# Altium footprint library SMD_Bauteile.PcbLib: 355 footprints (part 10 of 23)
Each footprint in its own frame and in the unit in brackets; x right, y up, seen from the top. Pads: shape width x height; smd on the part's side, far side on the other; paste and mask are expansions set on the pad; w line width, h text height; cw(c..) or ccw(c..) is an arc to the next point about the centre after c.
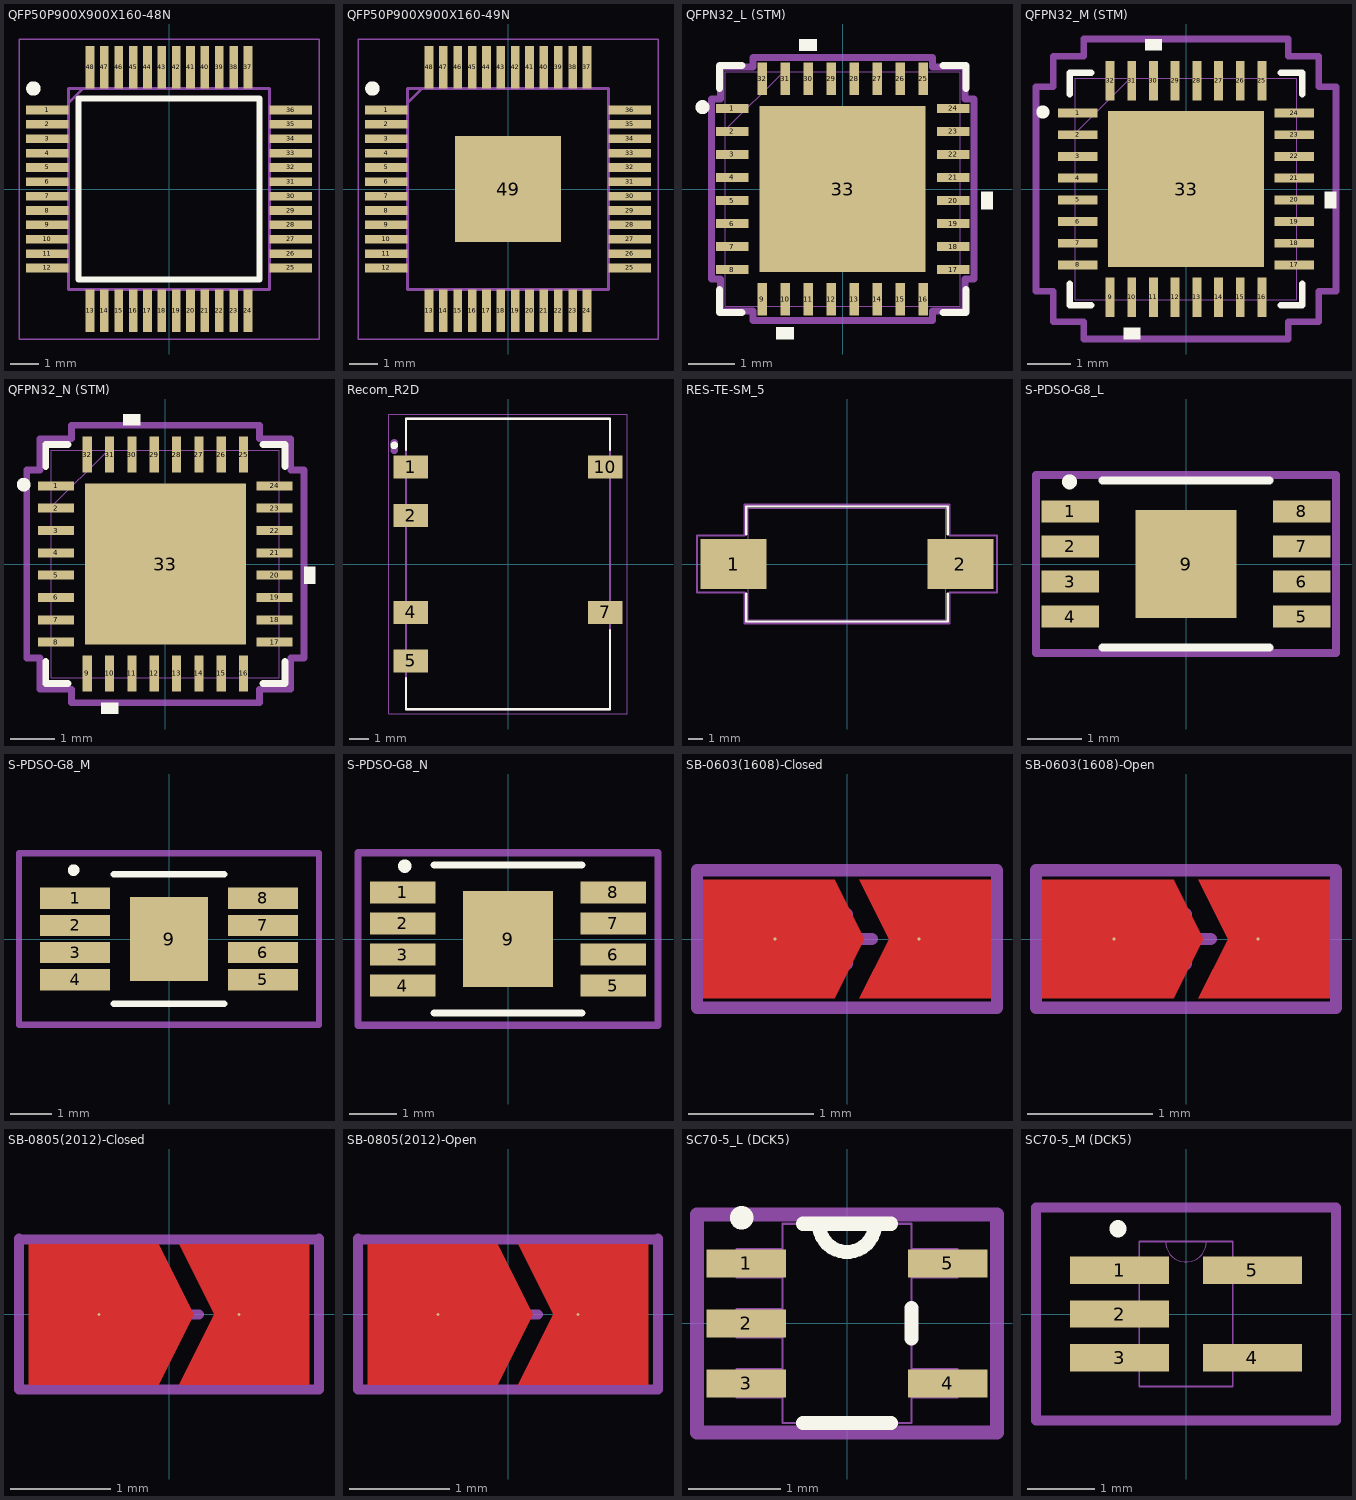
[diagram p9: the footprints below, top view; thin cyan lines are the x and y axes]

## QFP50P900X900X160-48N [mm]
pads (48):
  rect 1.475x0.3 smd: 1(-4.238,2.75) 2(-4.238,2.25) 3(-4.238,1.75) 4(-4.238,1.25) 5(-4.238,0.75) 6(-4.238,0.25) 7(-4.238,-0.25) 8(-4.238,-0.75) 9(-4.238,-1.25) 10(-4.238,-1.75) 11(-4.238,-2.25) 12(-4.238,-2.75) 25(4.238,-2.75) 26(4.238,-2.25) 27(4.238,-1.75) 28(4.238,-1.25) 29(4.238,-0.75) 30(4.238,-0.25) 31(4.238,0.25) 32(4.238,0.75) 33(4.238,1.25) 34(4.238,1.75) 35(4.238,2.25) 36(4.238,2.75)
  rect 0.3x1.475 smd: 13(-2.75,-4.238) 14(-2.25,-4.238) 15(-1.75,-4.238) 16(-1.25,-4.238) 17(-0.75,-4.238) 18(-0.25,-4.238) 19(0.25,-4.238) 20(0.75,-4.238) 21(1.25,-4.238) 22(1.75,-4.238) 23(2.25,-4.238) 24(2.75,-4.238) 37(2.75,4.238) 38(2.25,4.238) 39(1.75,4.238) 40(1.25,4.238) 41(0.75,4.238) 42(0.25,4.238) 43(-0.25,4.238) 44(-0.75,4.238) 45(-1.25,4.238) 46(-1.75,4.238) 47(-2.25,4.238) 48(-2.75,4.238)
Top Overlay:
  circle w0.25: c-4.725,3.5 r0.125
  lines w0.2: -3.15,-3.15 3.15,-3.15 3.15,3.15 -3.15,3.15 -3.15,-3.15
Mech Misc 1:
  lines w0.1: -3.5,3 -3,3.5 ; -3.5,-3.5 3.5,-3.5 3.5,3.5 -3.5,3.5 -3.5,-3.5
Mech 15:
  lines w0.05: -5.225,-5.225 5.225,-5.225 5.225,5.225 -5.225,5.225 -5.225,-5.225
3D body "LTC2357CLX-18#PBF.stp": height 1.6, standoff 0, extent -4.5,-4.5 4.5,4.5

## QFP50P900X900X160-49N [mm]
pads (49):
  rect 1.475x0.3 smd: 1(-4.238,2.75) 2(-4.238,2.25) 3(-4.238,1.75) 4(-4.238,1.25) 5(-4.238,0.75) 6(-4.238,0.25) 7(-4.238,-0.25) 8(-4.238,-0.75) 9(-4.238,-1.25) 10(-4.238,-1.75) 11(-4.238,-2.25) 12(-4.238,-2.75) 25(4.238,-2.75) 26(4.238,-2.25) 27(4.238,-1.75) 28(4.238,-1.25) 29(4.238,-0.75) 30(4.238,-0.25) 31(4.238,0.25) 32(4.238,0.75) 33(4.238,1.25) 34(4.238,1.75) 35(4.238,2.25) 36(4.238,2.75)
  rect 0.3x1.475 smd: 13(-2.75,-4.238) 14(-2.25,-4.238) 15(-1.75,-4.238) 16(-1.25,-4.238) 17(-0.75,-4.238) 18(-0.25,-4.238) 19(0.25,-4.238) 20(0.75,-4.238) 21(1.25,-4.238) 22(1.75,-4.238) 23(2.25,-4.238) 24(2.75,-4.238) 37(2.75,4.238) 38(2.25,4.238) 39(1.75,4.238) 40(1.25,4.238) 41(0.75,4.238) 42(0.25,4.238) 43(-0.25,4.238) 44(-0.75,4.238) 45(-1.25,4.238) 46(-1.75,4.238) 47(-2.25,4.238) 48(-2.75,4.238)
  rect 3.7x3.7 smd: 49(0,0)
Top Overlay:
  circle w0.25: c-4.725,3.5 r0.125
Mech 15:
  lines w0.1: -3.5,3 -3,3.5 ; -3.5,-3.5 -3.5,3.5 3.5,3.5 3.5,-3.5 -3.5,-3.5
Top 3D Body:
  lines w0.05: -5.225,-5.225 -5.225,5.225 5.225,5.225 5.225,-5.225 -5.225,-5.225

## QFPN32_L (STM) [mil]
pads (33):
  rect 27.87x8.03 smd paste+0 mask+0: 1(-94.44,68.92) 2(-94.44,49.23) 3(-94.44,29.54) 4(-94.44,9.85) 5(-94.44,-9.85) 6(-94.44,-29.54) 7(-94.44,-49.23) 8(-94.44,-68.92) 17(94.44,-68.92) 18(94.44,-49.23) 19(94.44,-29.54) 20(94.44,-9.85) 21(94.44,9.85) 22(94.44,29.54) 23(94.44,49.23) 24(94.44,68.92)
  rect 8.03x27.87 smd paste+0 mask+0: 9(-68.92,-94.44) 10(-49.23,-94.44) 11(-29.54,-94.44) 12(-9.85,-94.44) 13(9.85,-94.44) 14(29.54,-94.44) 15(49.23,-94.44) 16(68.92,-94.44) 25(68.92,94.44) 26(49.23,94.44) 27(29.54,94.44) 28(9.85,94.44) 29(-9.85,94.44) 30(-29.54,94.44) 31(-49.23,94.44) 32(-68.92,94.44)
  rect 142x142 smd paste-70.5 mask+0: 33(0,0)
Top Overlay:
  circle w10: c-120,70 r1
  region: -41.73,-118.37 -56.73,-118.37 -56.73,-128.37 -41.73,-128.37
  region: 118.37,-2.35 128.37,-2.35 128.37,-17.34 118.37,-17.34
  region: -22.04,118.37 -37.03,118.37 -37.03,128.37 -22.04,128.37
  lines w6: -105.5,-86.03 -105.5,-105.5 -86.03,-105.5 ; -105.5,86.03 -105.5,105.5 -86.03,105.5 ; 86.03,-105.5 105.5,-105.5 105.5,-86.03 ; 86.03,105.5 105.5,105.5 105.5,86.03
Top Paste:
  region: -3.94,67.06 -67.06,67.06 -67.06,3.94 -3.94,3.94
  region: -3.94,-3.94 -67.06,-3.94 -67.06,-67.06 -3.94,-67.06
  region: 67.06,67.06 3.94,67.06 3.94,3.94 67.06,3.94
  region: 67.06,-3.94 3.94,-3.94 3.94,-67.06 67.06,-67.06
Mech Misc 1:
  lines w1: -100.5,50.5 -50.5,100.5 ; -100.5,-100.5 100.5,-100.5 100.5,100.5 -100.5,100.5 -100.5,-100.5 ; -100.5,-73.92 -100.5,-63.91 -100.5,-73.92 ; -100.5,-54.23 -100.5,-44.23 -100.5,-54.23 ; -100.5,-34.53 -100.5,-24.54 -100.5,-34.53 ; -100.5,-14.85 -100.5,-4.84 -100.5,-14.85 ; -100.5,4.84 -100.5,14.85 -100.5,4.84 ; -100.5,24.54 -100.5,34.53 -100.5,24.54 ; -100.5,44.23 -100.5,54.23 -100.5,44.23 ; -100.5,63.91 -100.5,73.92 -100.5,63.91 ; -73.92,-100.5 -63.91,-100.5 -73.92,-100.5 ; -73.92,100.5 -63.91,100.5 -73.92,100.5 ; -54.23,-100.5 -44.23,-100.5 -54.23,-100.5 ; -54.23,100.5 -44.23,100.5 -54.23,100.5 ; -34.53,-100.5 -24.54,-100.5 -34.53,-100.5 ; -34.53,100.5 -24.54,100.5 -34.53,100.5 ; -14.85,-100.5 -4.84,-100.5 -14.85,-100.5 ; -14.85,100.5 -4.84,100.5 -14.85,100.5 ; 4.84,-100.5 14.85,-100.5 4.84,-100.5 ; 4.84,100.5 14.85,100.5 4.84,100.5 ; 24.54,-100.5 34.53,-100.5 24.54,-100.5 ; 24.54,100.5 34.53,100.5 24.54,100.5 ; 44.23,-100.5 54.23,-100.5 44.23,-100.5 ; 44.23,100.5 54.23,100.5 44.23,100.5 ; 63.91,-100.5 73.92,-100.5 63.91,-100.5 ; 63.91,100.5 73.92,100.5 63.91,100.5 ; 100.5,-73.92 100.5,-63.91 100.5,-73.92 ; 100.5,-54.23 100.5,-44.23 100.5,-54.23 ; 100.5,-34.53 100.5,-24.54 100.5,-34.53 ; 100.5,-14.85 100.5,-4.84 100.5,-14.85 ; 100.5,4.84 100.5,14.85 100.5,4.84 ; 100.5,24.54 100.5,34.53 100.5,24.54 ; 100.5,44.23 100.5,54.23 100.5,44.23 ; 100.5,63.91 100.5,73.92 100.5,63.91
Mech 15:
  lines w6: -112.37,-76.93 -104.5,-76.93 -104.5,-104.5 -76.93,-104.5 -76.93,-112.37 76.93,-112.37 76.93,-104.5 104.5,-104.5 104.5,-76.93 112.37,-76.93 112.37,76.93 104.5,76.93 104.5,104.5 76.93,104.5 76.93,112.37 -76.93,112.37 -76.93,104.5 -104.5,104.5 -104.5,76.93 -112.37,76.93 -112.37,-76.93
3D body "QFPN_91KEU6_STM.step": height 65.12, standoff 0, extent -100.52,-100.51 100.51,100.51

## QFPN32_M (STM) [mil]
pads (33):
  rect 35.75x8.03 smd paste+0 mask+0: 1(-98.37,68.92) 2(-98.37,49.23) 3(-98.37,29.54) 4(-98.37,9.85) 5(-98.37,-9.85) 6(-98.37,-29.54) 7(-98.37,-49.23) 8(-98.37,-68.92) 17(98.37,-68.92) 18(98.37,-49.23) 19(98.37,-29.54) 20(98.37,-9.85) 21(98.37,9.85) 22(98.37,29.54) 23(98.37,49.23) 24(98.37,68.92)
  rect 8.03x35.75 smd paste+0 mask+0: 9(-68.92,-98.37) 10(-49.23,-98.37) 11(-29.54,-98.37) 12(-9.85,-98.37) 13(9.85,-98.37) 14(29.54,-98.37) 15(49.23,-98.37) 16(68.92,-98.37) 25(68.92,98.37) 26(49.23,98.37) 27(29.54,98.37) 28(9.85,98.37) 29(-9.85,98.37) 30(-29.54,98.37) 31(-49.23,98.37) 32(-68.92,98.37)
  rect 142x142 smd paste-70.5 mask+0: 33(0,0)
Top Overlay:
  circle w10: c-130,70 r1
  region: -22.04,126.25 -37.03,126.25 -37.03,136.25 -22.04,136.25
  region: 126.25,-2.35 136.25,-2.35 136.25,-17.34 126.25,-17.34
  region: -41.73,-126.25 -56.73,-126.25 -56.73,-136.25 -41.73,-136.25
  lines w6: -105.5,-86.03 -105.5,-105.5 -86.03,-105.5 ; -105.5,86.03 -105.5,105.5 -86.03,105.5 ; 86.03,-105.5 105.5,-105.5 105.5,-86.03 ; 86.03,105.5 105.5,105.5 105.5,86.03
Top Paste:
  region: 67.06,-3.94 3.94,-3.94 3.94,-67.06 67.06,-67.06
  region: 67.06,67.06 3.94,67.06 3.94,3.94 67.06,3.94
  region: -3.94,-3.94 -67.06,-3.94 -67.06,-67.06 -3.94,-67.06
  region: -3.94,67.06 -67.06,67.06 -67.06,3.94 -3.94,3.94
Mech Misc 1:
  lines w1: -100.5,50.5 -50.5,100.5 ; -100.5,-100.5 -100.5,100.5 100.5,100.5 100.5,-100.5 -100.5,-100.5 ; -100.5,-73.92 -100.5,-63.91 -100.5,-73.92 ; -100.5,-54.23 -100.5,-44.23 -100.5,-54.23 ; -100.5,-34.53 -100.5,-24.54 -100.5,-34.53 ; -100.5,-14.85 -100.5,-4.84 -100.5,-14.85 ; -100.5,4.84 -100.5,14.85 -100.5,4.84 ; -100.5,24.54 -100.5,34.53 -100.5,24.54 ; -100.5,44.23 -100.5,54.23 -100.5,44.23 ; -100.5,63.91 -100.5,73.92 -100.5,63.91 ; -73.92,-100.5 -63.91,-100.5 -73.92,-100.5 ; -73.92,100.5 -63.91,100.5 -73.92,100.5 ; -54.23,-100.5 -44.23,-100.5 -54.23,-100.5 ; -54.23,100.5 -44.23,100.5 -54.23,100.5 ; -34.53,-100.5 -24.54,-100.5 -34.53,-100.5 ; -34.53,100.5 -24.54,100.5 -34.53,100.5 ; -14.85,-100.5 -4.84,-100.5 -14.85,-100.5 ; -14.85,100.5 -4.84,100.5 -14.85,100.5 ; 4.84,-100.5 14.85,-100.5 4.84,-100.5 ; 4.84,100.5 14.85,100.5 4.84,100.5 ; 24.54,-100.5 34.53,-100.5 24.54,-100.5 ; 24.54,100.5 34.53,100.5 24.54,100.5 ; 44.23,-100.5 54.23,-100.5 44.23,-100.5 ; 44.23,100.5 54.23,100.5 44.23,100.5 ; 63.91,-100.5 73.92,-100.5 63.91,-100.5 ; 63.91,100.5 73.92,100.5 63.91,100.5 ; 100.5,-73.92 100.5,-63.91 100.5,-73.92 ; 100.5,-54.23 100.5,-44.23 100.5,-54.23 ; 100.5,-34.53 100.5,-24.54 100.5,-34.53 ; 100.5,-14.85 100.5,-4.84 100.5,-14.85 ; 100.5,4.84 100.5,14.85 100.5,4.84 ; 100.5,24.54 100.5,34.53 100.5,24.54 ; 100.5,44.23 100.5,54.23 100.5,44.23 ; 100.5,63.91 100.5,73.92 100.5,63.91
Mech 15:
  lines w6: -136.25,-92.93 -136.25,92.93 -120.5,92.93 -120.5,120.5 -92.93,120.5 -92.93,136.25 92.93,136.25 92.93,120.5 120.5,120.5 120.5,92.93 136.25,92.93 136.25,-92.93 120.5,-92.93 120.5,-120.5 92.93,-120.5 92.93,-136.25 -92.93,-136.25 -92.93,-120.5 -120.5,-120.5 -120.5,-92.93 -136.25,-92.93
3D body "QFPN_91KEU6_STM.step": height 65.12, standoff 0, extent -100.51,-100.51 100.51,100.51

## QFPN32_N (STM) [mil]
pads (33):
  rect 31.81x8.03 smd paste+0 mask+0: 1(-96.41,68.92) 2(-96.41,49.23) 3(-96.41,29.54) 4(-96.41,9.85) 5(-96.41,-9.85) 6(-96.41,-29.54) 7(-96.41,-49.23) 8(-96.41,-68.92) 17(96.41,-68.92) 18(96.41,-49.23) 19(96.41,-29.54) 20(96.41,-9.85) 21(96.41,9.85) 22(96.41,29.54) 23(96.41,49.23) 24(96.41,68.92)
  rect 8.03x31.81 smd paste+0 mask+0: 9(-68.92,-96.41) 10(-49.23,-96.41) 11(-29.54,-96.41) 12(-9.85,-96.41) 13(9.85,-96.41) 14(29.54,-96.41) 15(49.23,-96.41) 16(68.92,-96.41) 25(68.92,96.41) 26(49.23,96.41) 27(29.54,96.41) 28(9.85,96.41) 29(-9.85,96.41) 30(-29.54,96.41) 31(-49.23,96.41) 32(-68.92,96.41)
  rect 142x142 smd paste-70.5 mask+0: 33(0,0)
Top Overlay:
  circle w10: c-125,70 r1
  region: -41.73,-122.31 -56.73,-122.31 -56.73,-132.31 -41.73,-132.31
  region: 122.31,-2.35 132.31,-2.35 132.31,-17.34 122.31,-17.34
  region: -22.04,122.31 -37.03,122.31 -37.03,132.31 -22.04,132.31
  lines w6: -105.5,-86.03 -105.5,-105.5 -86.03,-105.5 ; -105.5,86.03 -105.5,105.5 -86.03,105.5 ; 86.03,-105.5 105.5,-105.5 105.5,-86.03 ; 86.03,105.5 105.5,105.5 105.5,86.03
Top Paste:
  region: -3.94,67.06 -67.06,67.06 -67.06,3.94 -3.94,3.94
  region: -3.94,-3.94 -67.06,-3.94 -67.06,-67.06 -3.94,-67.06
  region: 67.06,67.06 3.94,67.06 3.94,3.94 67.06,3.94
  region: 67.06,-3.94 3.94,-3.94 3.94,-67.06 67.06,-67.06
Mech Misc 1:
  lines w1: -100.5,50.5 -50.5,100.5 ; -100.5,-100.5 100.5,-100.5 100.5,100.5 -100.5,100.5 -100.5,-100.5 ; -100.5,-73.92 -100.5,-63.91 -100.5,-73.92 ; -100.5,-54.23 -100.5,-44.23 -100.5,-54.23 ; -100.5,-34.53 -100.5,-24.54 -100.5,-34.53 ; -100.5,-14.85 -100.5,-4.84 -100.5,-14.85 ; -100.5,4.84 -100.5,14.85 -100.5,4.84 ; -100.5,24.54 -100.5,34.53 -100.5,24.54 ; -100.5,44.23 -100.5,54.23 -100.5,44.23 ; -100.5,63.91 -100.5,73.92 -100.5,63.91 ; -73.92,-100.5 -63.91,-100.5 -73.92,-100.5 ; -73.92,100.5 -63.91,100.5 -73.92,100.5 ; -54.23,-100.5 -44.23,-100.5 -54.23,-100.5 ; -54.23,100.5 -44.23,100.5 -54.23,100.5 ; -34.53,-100.5 -24.54,-100.5 -34.53,-100.5 ; -34.53,100.5 -24.54,100.5 -34.53,100.5 ; -14.85,-100.5 -4.84,-100.5 -14.85,-100.5 ; -14.85,100.5 -4.84,100.5 -14.85,100.5 ; 4.84,-100.5 14.85,-100.5 4.84,-100.5 ; 4.84,100.5 14.85,100.5 4.84,100.5 ; 24.54,-100.5 34.53,-100.5 24.54,-100.5 ; 24.54,100.5 34.53,100.5 24.54,100.5 ; 44.23,-100.5 54.23,-100.5 44.23,-100.5 ; 44.23,100.5 54.23,100.5 44.23,100.5 ; 63.91,-100.5 73.92,-100.5 63.91,-100.5 ; 63.91,100.5 73.92,100.5 63.91,100.5 ; 100.5,-73.92 100.5,-63.91 100.5,-73.92 ; 100.5,-54.23 100.5,-44.23 100.5,-54.23 ; 100.5,-34.53 100.5,-24.54 100.5,-34.53 ; 100.5,-14.85 100.5,-4.84 100.5,-14.85 ; 100.5,4.84 100.5,14.85 100.5,4.84 ; 100.5,24.54 100.5,34.53 100.5,24.54 ; 100.5,44.23 100.5,54.23 100.5,44.23 ; 100.5,63.91 100.5,73.92 100.5,63.91
Mech 15:
  lines w6: -122.31,-82.93 -110.5,-82.93 -110.5,-110.5 -82.93,-110.5 -82.93,-122.31 82.93,-122.31 82.93,-110.5 110.5,-110.5 110.5,-82.93 122.31,-82.93 122.31,82.93 110.5,82.93 110.5,110.5 82.93,110.5 82.93,122.31 -82.93,122.31 -82.93,110.5 -110.5,110.5 -110.5,82.93 -122.31,82.93 -122.31,-82.93
3D body "QFPN_91KEU6_STM.step": height 65.12, standoff 0, extent -100.51,-100.51 100.51,100.51

## Recom_R2D [mm]
height 9
pads (6):
  rect 1.8x1.2 smd: 1(-5.1,5.08) 2(-5.1,2.54) 4(-5.1,-2.54) 5(-5.1,-5.08) 7(5.1,-2.54) 10(5.1,5.08)
Top Overlay:
  circle w0.2: c-5.969,6.223 r0.1
  lines w0.127: -5.35,-6 -5.35,-7.62 5.35,-7.62 5.35,-3.47 ; -5.35,6 -5.35,7.62 5.35,7.62 5.35,6
Mechanical 4:
  circle w0.2: c-5.969,5.969 r0.1
  circle w0.2: c-5.969,6.35 r0.1
  lines w0.127: -5.35,-7.62 5.35,-7.62 ; -5.35,-7.62 -5.35,7.62 ; -5.35,-7.62 5.35,-7.62 ; -5.35,-7.62 -5.35,7.62 ; -5.35,7.62 5.35,7.62 ; -5.35,7.62 5.35,7.62 ; 5.35,-7.62 5.35,7.62 ; 5.35,-7.62 5.35,7.62
Mechanical 16:
  lines w0.05: -6.25,-7.87 6.25,-7.87 6.25,7.87 -6.25,7.87 -6.25,-7.87
3D body "Recom_R2D.step": height 9.05, standoff 0.05, extent -5.55,-7.625 5.55,7.625

## RES-TE-SM_5 [mil]
height 267.72
pads (2):
  rect 177x134 smd paste+0 mask+0: 1(-305,0) 2(305,0)
Top Overlay:
  lines w6: -271,-80.1 -271,-154.5 271,-154.5 271,-80.1 ; -271,80.1 -271,154.5 271,154.5 271,80.1
Top Courtyard:
  lines w1: -232,-149.5 276,-149.5 ; -232,149.5 276,149.5
Mech Misc 1:
  lines w1: -266,-149.5 -266,149.5 266,149.5 266,-149.5 -266,-149.5
Mech 15:
  lines w6: -403.5,-77 -276,-77 -276,-159.5 276,-159.5 276,-77 403.5,-77 403.5,77 276,77 276,159.5 -276,159.5 -276,77 -403.5,77 -403.5,-77
3D body "c-7-1879233-3-ba-3d.stp": height 267.72, standoff -0.01, extent -268.11,-143.7 268.11,143.7

## S-PDSO-G8_L [mil] "TI PowerPAD TM Plastic small outline"
height 39.37
pads (9):
  rect 42x16 smd mask+4: 1(-84.5,38.39) 2(-84.5,12.8) 3(-84.5,-12.8) 4(-84.5,-38.39) 5(84.5,-38.39) 6(84.5,-12.8) 7(84.5,12.8) 8(84.5,38.39)
  rect 74x79 smd: 9(0,0)
Top Overlay:
  circle w10: c-85,60 r0.5
  lines w6: -61,-61 61,-61 ; -61,61 61,61
Mech 15:
  lines w6: -109.5,-65 109.5,-65 109.5,65 -109.5,65 -109.5,-65
3D body "S-PDSO-G8.stp": height 37.12, standoff -0.88, extent -96.5,-59 96.5,59

## S-PDSO-G8_M [mil] "TI PowerPAD TM Plastic small outline"
height 39.37
pads (9):
  rect 66x20 smd mask+4: 1(-88.5,38.39) 2(-88.5,12.8) 3(-88.5,-12.8) 4(-88.5,-38.39) 5(88.5,-38.39) 6(88.5,-12.8) 7(88.5,12.8) 8(88.5,38.39)
  rect 74x79 smd: 9(0,0)
Top Overlay:
  circle w10: c-90,65 r0.5
  lines w6: -51.97,-61 51.97,-61 ; -51.97,61 51.97,61
Mech 15:
  lines w6: -141.5,-81 141.5,-81 141.5,81 -141.5,81 -141.5,-81
3D body "S-PDSO-G8.stp": height 37.12, standoff -0.88, extent -96.5,-59 96.5,59

## S-PDSO-G8_N [mil] "TI PowerPAD TM Plastic small outline"
height 43.31
pads (9):
  rect 54x18 smd mask+4: 1(-86.5,38.39) 2(-86.5,12.8) 3(-86.5,-12.8) 4(-86.5,-38.39) 5(86.5,-38.39) 6(86.5,-12.8) 7(86.5,12.8) 8(86.5,38.39)
  rect 74x79 smd: 9(0,0)
Top Overlay:
  circle w10: c-85,60 r0.5
  lines w6: -61,-61 61,-61 ; -61,61 61,61
Mech 15:
  lines w6: -123.5,-71 123.5,-71 123.5,71 -123.5,71 -123.5,-71
3D body "S-PDSO-G8.stp": height 37.12, standoff -0.88, extent -96.5,-59 96.5,59

## SB-0603(1608)-Closed [mil] "Solder Bridge 0603 (1608) in closed state"
pads (2):
  round 1 smd paste-0.79 mask+0: 1(-22.64,0) 2(22.64,0)
Top Layer:
  region: 45.28,18.7 3.94,18.7 13.29,0 3.94,-18.7 45.28,-18.7
  region: -45.28,18.7 -3.94,18.7 5.41,0 -3.94,-18.7 -45.28,-18.7
Top Component Center:
  lines w3.94: -7.87,0 7.87,0 ; 0,-7.87 0,7.87
Top Courtyard (Mech26):
  lines w3.94: -47.24,-21.65 47.24,-21.65 47.24,21.65 -47.24,21.65 -47.24,-21.65

## SB-0603(1608)-Open [mil] "Solder Bridge 0603 (1608) in open state"
pads (2):
  round 1 smd paste-99999 mask+0: 1(-22.64,0) 2(22.64,0)
Top Layer:
  region: 45.28,18.7 3.94,18.7 13.29,0 3.94,-18.7 45.28,-18.7
  region: -45.28,18.7 -3.94,18.7 5.41,0 -3.94,-18.7 -45.28,-18.7
Top Component Center:
  lines w3.94: -7.87,0 7.87,0 ; 0,-7.87 0,7.87
Top Courtyard (Mech26):
  lines w3.94: -47.24,-21.65 47.24,-21.65 47.24,21.65 -47.24,21.65 -47.24,-21.65

## SB-0805(2012)-Closed [mil] "Solder Bridge 0805 (2012) in closed state"
pads (2):
  round 1 smd paste-0.79 mask+0: 1(-27.56,0) 2(27.56,0)
Top Layer:
  region: -55.12,27.56 -3.94,27.56 9.84,0 -3.94,-27.56 -55.12,-27.56
  region: 55.12,27.56 3.94,27.56 17.72,0 3.94,-27.56 55.12,-27.56
Top Component Center:
  lines w3.94: -11.81,0 11.81,0 ; 0,-11.81 0,11.81
Top Courtyard (Mech26):
  lines w3.94: -59.06,29.53 59.06,29.53 ; -59.06,29.92 -59.06,-29.53 59.06,-29.53 59.06,29.92

## SB-0805(2012)-Open [mil] "Solder Bridge 0805 (2012) in open state"
pads (2):
  round 1 smd paste-99999 mask+0: 1(-27.56,0) 2(27.56,0)
Top Layer:
  region: -55.12,27.56 -3.94,27.56 9.84,0 -3.94,-27.56 -55.12,-27.56
  region: 55.12,27.56 3.94,27.56 17.72,0 3.94,-27.56 55.12,-27.56
Top Component Center:
  lines w3.94: -11.81,0 11.81,0 ; 0,-11.81 0,11.81
Top Courtyard (Mech26):
  lines w3.94: -59.06,29.53 59.06,29.53 ; -59.06,29.92 -59.06,-29.53 59.06,-29.53 59.06,29.92

## SC70-5_L (DCK5) [mil]
height 43.31
pads (5):
  rect 34x12 smd: 1(-43,25.59) 2(-43,0) 3(-43,-25.59) 4(43,-25.59) 5(43,25.59)
Top Overlay:
  circle w10: c-45,45 r0.01
  lines w6: -18.75,-42.5 18.75,-42.5 ; -18.75,42.5 18.75,42.5 ; -12,42.5 ccw(c0,42.5) 12,42.5 ; 27.5,-6.49 27.5,6.49
Mech Misc 1:
  lines w0: -12,42.5 ccw(c0,42.5) 12,42.5
  lines w1: -47,-31.59 -47,-19.59 -27.5,-19.59 -27.5,-31.59 -47,-31.59 ; -47,-6 -47,6 -27.5,6 -27.5,-6 -47,-6 ; -47,19.59 -47,31.59 -27.5,31.59 -27.5,19.59 -47,19.59 ; -27.5,-42.5 27.5,-42.5 27.5,42.5 -27.5,42.5 -27.5,-42.5 ; 27.5,-31.59 27.5,-19.59 47,-19.59 47,-31.59 27.5,-31.59 ; 27.5,19.59 27.5,31.59 47,31.59 47,19.59 27.5,19.59
Mech 15:
  lines w6: -64,-46.5 -64,46.5 64,46.5 64,-46.5 -64,-46.5
3D body "SOT-SC70-5.stp": height 39.37, standoff 0, extent -41.33,-39.37 41.34,39.37

## SC70-5_M (DCK5) [mil]
height 43.31
pads (5):
  rect 58x16 smd: 1(-39,25.59) 2(-39,0) 3(-39,-25.59) 4(39,-25.59) 5(39,25.59)
Top Overlay:
  circle w10: c-40,50 r0.01
Mech Misc 1:
  lines w0: -12,42.5 ccw(c0,42.5) 12,42.5
  lines w1: -47,-31.59 -27.5,-31.59 -27.5,-19.59 -47,-19.59 -47,-31.59 ; -47,-6 -27.5,-6 -27.5,6 -47,6 -47,-6 ; -47,19.59 -27.5,19.59 -27.5,31.59 -47,31.59 -47,19.59 ; -27.5,-42.5 -27.5,42.5 27.5,42.5 27.5,-42.5 -27.5,-42.5 ; 27.5,-31.59 47,-31.59 47,-19.59 27.5,-19.59 27.5,-31.59 ; 27.5,19.59 47,19.59 47,31.59 27.5,31.59 27.5,19.59
Mech 15:
  lines w6: -88,-62.5 88,-62.5 88,62.5 -88,62.5 -88,-62.5
3D body "SOT-SC70-5.stp": height 39.37, standoff 0, extent -41.33,-39.37 41.34,39.37